# Altium integrated library Resistance.IntLib: 25 symbols
Pins are listed as number, name and electrical type; pins without a type are passive.

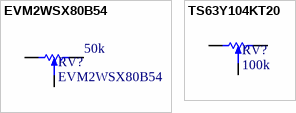
[diagram p0: symbols EVM2WSX80B54 to TS63Y104KT20]

## EVM2WSX80B54
designator RV?  value 50k
TRIMMER 50K OHM 0.15W SMD; Manufacturer: PANASONIC ELECTRONIC COMPONENTS; Power: 150mW; Manufacturer Part Number: EVM2WSX80B54; Supplier 1: Farnell; ComponentLink1URL: http://www.farnell.com/datasheets/2244143.pdf; ComponentLink1Description: Datasheet; Supplier Part Number 1: 1849775
footprint TRIM_PANASONIC_EVM-2W (SMT Trimmer Potentiometers)
pins: 1, 2, 3
2 alternate drawings of the same symbol

## TS63Y104KT20
designator RV?, comment 100k
TRIMMER CMS 13 TOURS 100K; Manufacturer: VISHAY SFERNICE; Manufacturer Part Number: TS63Y104KT20; Value: 100k; Supplier 1: Farnell; Supplier Part Number 1: 1141498; ComponentLink1URL: http://www.farnell.com/datasheets/2050493.pdf; ComponentLink1Description: Datasheet
footprint TS63Y (VISHAY SFERNICE  TS63Y104KT20  TRIMMER CMS 13 TOURS 100K)
pins: 1, 2, 3
2 alternate drawings of the same symbol


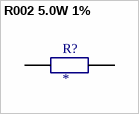
[diagram p1: symbol R002 5.0W 1%]

## R002 5.0W 1%
designator R?
RESISTANCE R002 5.0W 1%; Manufacturer: TE CONNECTIVITY; Manufacturer Part Number: TLRS157550ER002FTDG; Description: TE CONNECTIVITY - TLRS157550ER002FTDG - RESISTANCE R002 5.0W 1% 1K BOBINE; Value: 0.002; Supplier 1: Farnell; Supplier Part Number 1: 2116043; Pricing: 1=2,3, 25=2, 100=1,81, 500=1,63, 2000=1,31 (EUR); ComponentLink1URL: http://www.farnell.com/datasheets/1751344.pdf; ComponentLink1Description: http://www.farnell.com/datasheets/1751344.pdf
footprint TLRS1575 (TLRS Series)
pins: 1, 2


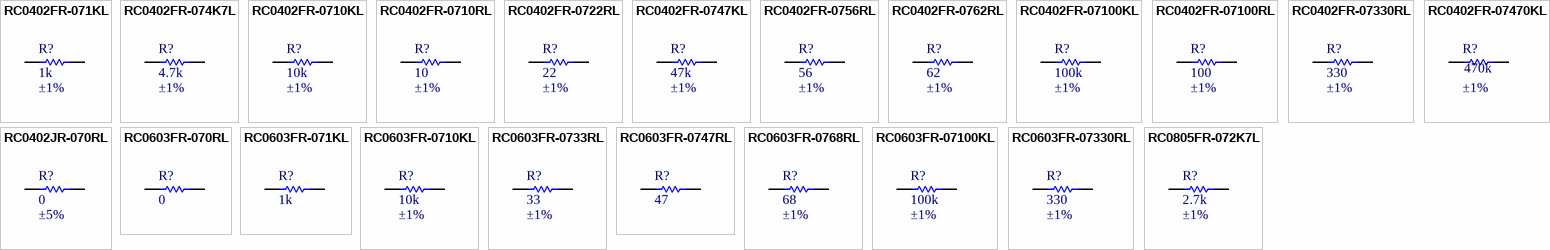
[diagram p2: symbols RC0402FR-071KL to RC0805FR-072K7L]

## RC0402FR-071KL
designator R?  value 1k  Precision: ±1%  (hidden comment: RC0402FR-071KL)
RES SMD 1K OHM 1% 1/16W 0402; Manufacturer: Yageo; Power: 63mW; Vmax: 50V; Type: Thick Film; ComponentLink1Description: Manufacturer; ComponentLink1URL: http://www.yageo.com/NewPortal/_en/index.jsp; ComponentLink2Description: Datasheet; ComponentLink2URL: http://www.farnell.com/datasheets/2167052.pdf; Manufacturer Part Number: RC0402FR-071KL; Supplier 1: Farnell; Supplier Part Number 1: 9239235
footprint RESC1005X04N (Chip Resistor, 2-Leads, Body 1,1x0,5mm, IPC Medium Density)
pins: 1, 2

## RC0402FR-074K7L
designator R?  value 4.7k  Precision: ±1%
RES SMD 4K7 OHM 1% 1/16W 0402; Manufacturer: Yageo; Manufacturer Part Number: RC0402FR-074K7L; Power: 63mW; Vmax: 50V; Type: Thick Film; ComponentLink1Description: Manufacturer; ComponentLink1URL: http://www.yageo.com/NewPortal/_en/index.jsp; ComponentLink2Description: Datasheet; ComponentLink2URL: http://www.farnell.com/datasheets/2167052.pdf; Supplier 1: Farnell; Supplier Part Number 1: 9239316
footprint RESC1005X04N (Chip Resistor, 2-Leads, Body 1,1x0,5mm, IPC Medium Density)
pins: 1, 2

## RC0402FR-0710KL
designator R?  value 10k  Precision: ±1%  (hidden comment: RC0402FR-0710KL)
RES SMD 10K OHM 1% 1/16W 0402; Manufacturer: Yageo; Power: 63mW; Vmax: 50V; Type: Thick Film; ComponentLink1Description: Manufacturer; ComponentLink1URL: http://www.yageo.com/NewPortal/_en/index.jsp; ComponentLink2Description: Datasheet; ComponentLink2URL: http://www.farnell.com/datasheets/2167052.pdf; Supplier 1: Farnell; Supplier Part Number 1: 9239359; Manufacturer Part Number: RC0402FR-0710KL
footprint RESC1005X04N (Chip Resistor, 2-Leads, Body 1,1x0,5mm, IPC Medium Density)
footprint RESC1005X04L (Chip Resistor, 2-Leads, Body 1,1x0,5mm, IPC High Density)
pins: 1, 2

## RC0402FR-0710RL
designator R?  value 10  Precision: ±1%  (hidden comment: RC0402FR-0710RL)
RES SMD 10 OHM 1% 1/16W 0402; Manufacturer: Yageo; Power: 63mW; Vmax: 50V; Type: Thick Film; ComponentLink1Description: Manufacturer; ComponentLink1URL: http://www.yageo.com/NewPortal/_en/index.jsp; ComponentLink2Description: Datasheet; ComponentLink2URL: http://www.farnell.com/datasheets/1018594.pdf; Manufacturer Part Number: RC0402FR-0710RL; Supplier 1: Farnell; Supplier Part Number 1: 9238999
footprint RESC1005X04N (Chip Resistor, 2-Leads, Body 1,1x0,5mm, IPC Medium Density)
pins: 1, 2

## RC0402FR-0722RL
designator R?  value 22  Precision: ±1%  (hidden comment: RC0402FR-0722RL)
RES SMD 22 OHM 1% 1/16W 0402; Manufacturer: Yageo; Power: 63mW; Vmax: 50V; Type: Thick Film; ComponentLink1Description: Manufacturer; ComponentLink1URL: http://www.yageo.com/NewPortal/_en/index.jsp; ComponentLink2Description: Datasheet; ComponentLink2URL: http://www.farnell.com/datasheets/2167052.pdf; Manufacturer Part Number: RC0402FR-0722RL; Supplier 1: Farnell; Supplier Part Number 1: 9239030
footprint RESC1005X04N (Chip Resistor, 2-Leads, Body 1,1x0,5mm, IPC Medium Density)
pins: 1, 2

## RC0402FR-0747KL
designator R?  value 47k  Precision: ±1%
RES SMD 47K OHM 1% 1/16W 0402; Manufacturer: Yageo; Manufacturer Part Number: RC0402FR-0747KL; Power: 63mW; Vmax: 50V; Type: Thick Film; ComponentLink1Description: Manufacturer; ComponentLink1URL: http://www.yageo.com/NewPortal/_en/index.jsp; ComponentLink2Description: Datasheet; ComponentLink2URL: http://www.farnell.com/datasheets/2167052.pdf; Supplier 1: Farnell; Supplier Part Number 1: 9239430
footprint RESC1005X04N (Chip Resistor, 2-Leads, Body 1,1x0,5mm, IPC Medium Density)
pins: 1, 2

## RC0402FR-0756RL
designator R?  value 56  Precision: ±1%  (hidden comment: RC0402FR-0756RL)
RES SMD 56 OHM 1% 1/16W 0402; Manufacturer: Yageo; Power: 63mW; Vmax: 50V; Type: Thick Film; ComponentLink1Description: Manufacturer; ComponentLink1URL: http://www.yageo.com/NewPortal/_en/index.jsp; ComponentLink2Description: Datasheet; ComponentLink2URL: http://www.farnell.com/datasheets/2167052.pdf; Manufacturer Part Number: RC0402FR-0756RL; Supplier 1: Farnell; Supplier Part Number 1: 9239081
footprint RESC1005X04N (Chip Resistor, 2-Leads, Body 1,1x0,5mm, IPC Medium Density)
pins: 1, 2

## RC0402FR-0762RL
designator R?  value 62  Precision: ±1%  (hidden comment: RC0402FR-0762RL)
RES SMD 62 OHM 1% 1/16W 0402; Manufacturer: Yageo; Power: 63mW; Vmax: 50V; Type: Thick Film; ComponentLink1Description: Manufacturer; ComponentLink1URL: http://www.yageo.com/NewPortal/_en/index.jsp; ComponentLink2Description: Datasheet; ComponentLink2URL: http://www.farnell.com/datasheets/2167052.pdf; Manufacturer Part Number: RC0402FR-0762RL; Supplier 1: Farnell; Supplier Part Number 1: 1458813
footprint RESC1005X04N (Chip Resistor, 2-Leads, Body 1,1x0,5mm, IPC Medium Density)
pins: 1, 2

## RC0402FR-07100KL
designator R?  value 100k  Precision: ±1%  (hidden comment: RC0402FR-07100KL)
RES SMD 100K OHM 1% 1/16W 0402; Manufacturer: Yageo; Power: 63mW; Vmax: 50V; Type: Thick Film; ComponentLink1Description: Manufacturer; ComponentLink1URL: http://www.yageo.com/NewPortal/_en/index.jsp; ComponentLink2Description: Datasheet; ComponentLink2URL: http://www.farnell.com/datasheets/2167052.pdf; Manufacturer Part Number: RC0402FR-07100KL; Supplier 1: Farnell; Supplier Part Number 1: 9239472
footprint RESC1005X04N (Chip Resistor, 2-Leads, Body 1,1x0,5mm, IPC Medium Density)
pins: 1, 2

## RC0402FR-07100RL
designator R?  value 100  Precision: ±1%  (hidden comment: RC0402FR-07100RL)
RES SMD 100 OHM 1% 1/16W 0402; Manufacturer: Yageo; Power: 63mW; Vmax: 50V; Type: Thick Film; ComponentLink1Description: Manufacturer; ComponentLink1URL: http://www.yageo.com/NewPortal/_en/index.jsp; ComponentLink2Description: Datasheet; ComponentLink2URL: http://www.farnell.com/datasheets/2167052.pdf; Manufacturer Part Number: RC0402FR-07100RL; Supplier 1: Farnell; Supplier Part Number 1: 9239111
footprint RESC1005X04N (Chip Resistor, 2-Leads, Body 1,1x0,5mm, IPC Medium Density)
pins: 1, 2

## RC0402FR-07330RL
designator R?  value 330  Precision: ±1%  (hidden comment: RC0402FR-07330RL)
RES SMD 330 OHM 1% 1/16W 0402; Manufacturer: Yageo; Power: 63mW; Vmax: 50V; Type: Thick Film; ComponentLink1Description: Manufacturer; ComponentLink1URL: http://www.yageo.com/NewPortal/_en/index.jsp; ComponentLink2Description: Datasheet; ComponentLink2URL: http://www.farnell.com/datasheets/2167052.pdf; Manufacturer Part Number: RC0402FR-07330RL; Supplier 1: Farnell; Supplier Part Number 1: 9239170
footprint RESC1005X04N (Chip Resistor, 2-Leads, Body 1,1x0,5mm, IPC Medium Density)
pins: 1, 2

## RC0402FR-07470KL
designator R?  value 470k  Precision: ±1%
RES SMD 470K OHM 1% 1/16W 0402; Manufacturer: Yageo; Manufacturer Part Number: RC0402FR-07470KL; Power: 63mW; Vmax: 50V; Type: Thick Film; ComponentLink1Description: Manufacturer; ComponentLink1URL: http://www.yageo.com/NewPortal/_en/index.jsp; ComponentLink2Description: Datasheet; ComponentLink2URL: http://www.farnell.com/datasheets/2167052.pdf; Supplier 1: Farnell; Supplier Part Number 1: 9239553
footprint RESC1005X04N (Chip Resistor, 2-Leads, Body 1,1x0,5mm, IPC Medium Density)
pins: 1, 2

## RC0402JR-070RL
designator R?  value 0  Precision: ±5%  (hidden comment: RC0402JR-070RL)
RES SMD 0 OHM 5% 1/16W 0402; Manufacturer: Yageo; Power: 63mW; Vmax: 50V; Type: Thick Film; ComponentLink1Description: Manufacturer; ComponentLink1URL: http://www.yageo.com/NewPortal/_en/index.jsp; ComponentLink2Description: Datasheet; ComponentLink2URL: http://www.farnell.com/datasheets/1018594.pdf; Manufacturer Part Number: RC0402JR-070RL; Supplier 1: Farnell; Supplier Part Number 1: 9232516
footprint RESC1005X04N (Chip Resistor, 2-Leads, Body 1,1x0,5mm, IPC Medium Density)
pins: 1, 2

## RC0603FR-070RL
designator R?  value 0  (hidden comment: RC0603FR-070RL)
RES SMD 0 OHM 1% 1/10W 0603; Manufacturer: Yageo; Power: 100mW; Vmax: 50V; Manufacturer Part Number: RC0603FR-070RL; Type: Thick Film; ComponentLink1Description: Manufacturer; ComponentLink1URL: http://www.yageo.com/NewPortal/_en/index.jsp; ComponentLink2Description: Datasheet; ComponentLink2URL: http://www.farnell.com/datasheets/2167052.pdf; Supplier 1: Farnell; Precision: ±1%; Supplier Part Number 1: 2309106
footprint RESC1608X06N (Chip Resistor, 2-Leads, Body 1,6x0,8mm, IPC Medium Density)
pins: 1, 2

## RC0603FR-071KL
designator R?  value 1k  (hidden comment: RC0603FR-071KL)
RES SMD 1K OHM 1% 1/10W 0603; Manufacturer: Yageo; Power: 100mW; Vmax: 50V; Manufacturer Part Number: RC0603FR-071KL; Type: Thick Film; ComponentLink1Description: Manufacturer; ComponentLink1URL: http://www.yageo.com/NewPortal/_en/index.jsp; ComponentLink2Description: Datasheet; ComponentLink2URL: http://www.farnell.com/datasheets/2167052.pdf; Precision: ±1%; Supplier 1: Farnell; Supplier Part Number 1: 9238484
footprint RESC1608X06N (Chip Resistor, 2-Leads, Body 1,6x0,8mm, IPC Medium Density)
pins: 1, 2

## RC0603FR-0710KL
designator R?  value 10k  Precision: ±1%  (hidden comment: RC0603FR-0710KL)
RES SMD 10K OHM 1% 1/10W 0603; Manufacturer: Yageo; Power: 100mW; Vmax: 50V; Manufacturer Part Number: RC0603FR-0710KL; Type: Thick Film; ComponentLink1Description: Manufacturer; ComponentLink1URL: http://www.yageo.com/NewPortal/_en/index.jsp; ComponentLink2Description: Datasheet; ComponentLink2URL: http://www.farnell.com/datasheets/2167052.pdf; Supplier 1: Farnell; Supplier Part Number 1: 9238603
footprint RESC1608X06N (Chip Resistor, 2-Leads, Body 1,6x0,8mm, IPC Medium Density)
pins: 1, 2

## RC0603FR-0733RL
designator R?  value 33  Precision: ±1%  (hidden comment: RC0603FR-0733RL)
RES SMD 33 OHM 1% 1/10W 0603; Manufacturer: Yageo; Power: 100mW; Vmax: 50V; Manufacturer Part Number: RC0603FR-0733RL; Type: Thick Film; ComponentLink1Description: Manufacturer; ComponentLink1URL: http://www.yageo.com/NewPortal/_en/index.jsp; ComponentLink2Description: Datasheet; ComponentLink2URL: http://www.farnell.com/datasheets/2167052.pdf; Supplier 1: Farnell; Supplier Part Number 1: 9238301
footprint RESC1608X06N (Chip Resistor, 2-Leads, Body 1,6x0,8mm, IPC Medium Density)
pins: 1, 2

## RC0603FR-0747RL
designator R?  value 47  (hidden comment: RC0603FR-0747RL)
RES SMD 47 OHM 1% 1/10W 0603; Manufacturer: Yageo; Power: 100mW; Vmax: 50V; Manufacturer Part Number: RC0603FR-0747RL; Type: Thick Film; ComponentLink1Description: Manufacturer; ComponentLink1URL: http://www.yageo.com/NewPortal/_en/index.jsp; ComponentLink2Description: Datasheet; ComponentLink2URL: http://www.farnell.com/datasheets/2167052.pdf; Precision: ±1%; Supplier 1: Farnell; Supplier Part Number 1: 9238328
footprint RESC1608X06N (Chip Resistor, 2-Leads, Body 1,6x0,8mm, IPC Medium Density)
pins: 1, 2

## RC0603FR-0768RL
designator R?  value 68  Precision: ±1%  (hidden comment: RC0603FR-0768RL)
RES SMD 68 OHM 1% 1/10W 0603; Manufacturer: Yageo; Power: 100mW; Vmax: 50V; Manufacturer Part Number: RC0603FR-0768RL; Type: Thick Film; ComponentLink1Description: Manufacturer; ComponentLink1URL: http://www.yageo.com/NewPortal/_en/index.jsp; ComponentLink2Description: Datasheet; ComponentLink2URL: http://www.farnell.com/datasheets/1868787.pdf; Supplier 1: Farnell; Supplier Part Number 1: 9238344
footprint RESC1608X06N (Chip Resistor, 2-Leads, Body 1,6x0,8mm, IPC Medium Density)
pins: 1, 2

## RC0603FR-07100KL
designator R?  value 100k  Precision: ±1%  (hidden comment: RC0603FR-07100KL)
RES SMD 100K OHM 1% 1/10W 0603; Manufacturer: Yageo; Power: 100mW; Vmax: 50V; Manufacturer Part Number: RC0603FR-07100KL; Type: Thick Film; ComponentLink1Description: Manufacturer; ComponentLink1URL: http://www.yageo.com/NewPortal/_en/index.jsp; ComponentLink2Description: Datasheet; ComponentLink2URL: http://www.farnell.com/datasheets/2167052.pdf; Supplier 1: Farnell; Supplier Part Number 1: 2309107
footprint RESC1608X06N (Chip Resistor, 2-Leads, Body 1,6x0,8mm, IPC Medium Density)
pins: 1, 2

## RC0603FR-07330RL
designator R?  value 330  Precision: ±1%  (hidden comment: RC0603FR-07330RL)
RES SMD 330 OHM 1% 1/10W 0603; Manufacturer: Yageo; Power: 100mW; Vmax: 50V; Manufacturer Part Number: RC0603FR-07330RL; Type: Thick Film; ComponentLink1Description: Manufacturer; ComponentLink1URL: http://www.yageo.com/NewPortal/_en/index.jsp; ComponentLink2Description: Datasheet; ComponentLink2URL: http://www.farnell.com/datasheets/2167052.pdf; Supplier 1: Farnell; Supplier Part Number 1: 9238425
footprint RESC1608X06N (Chip Resistor, 2-Leads, Body 1,6x0,8mm, IPC Medium Density)
pins: 1, 2

## RC0805FR-072K7L
designator R?  value 2.7k  Precision: ±1%  (hidden comment: RC0805FR-072K7L)
RES SMD 2K7 OHM 1% 1/8W 0805; Manufacturer: Yageo; Power: 125mW; Vmax: 50V; Manufacturer Part Number: RC0805FR-072K7L; Type: Thick Film; ComponentLink1Description: Manufacturer; ComponentLink1URL: http://www.yageo.com/NewPortal/_en/index.jsp; ComponentLink2Description: Datasheet; ComponentLink2URL: http://www.farnell.com/datasheets/444164.pdf; Supplier 1: Farnell; Supplier Part Number 1: 9237666
footprint RESC2012X06M (Chip Resistor, 2-Leads, Body 2,0x1,3mm, IPC Low Density)
pins: 1, 2